# Altium schematic symbol library LATTICEPLDS_Library.SchLib: 291 symbols (part 6 of 32) (continued)
## LCMXO3L-4300/6900-BG400 (continued)
part D pins: M6 PL18C (io), M7 PL18D (io), M8 VCCIO3 (power), M9 VCCIO3 (power), N3 PL18A (io), N4 PL18B (io), N5 PL21C (io), N6 PL21D (io), P3 PL19A (io), P4 PL19B (io), P5 PL24C (io), P6 PL24D (io), R1 PL19C (io), R2 PL19D (io), R3 PL22C (io), R4 PL22D (io), R5 PL25B (io), T1 PL21A (io), T2 PL21B (io), T3 PL23A (io), T4 PL23B (io), T5 PL25A (io), U1 PL22A (io), U2 PL22B (io), U4 PL25C (io), U5 PL25D (io), V1 PL23C (io), V2 PL23D (io), V3 PL24A (io), V4 PL24B (io)
part E pins: J1 PL10B (io), J2 PL10A (io), K1 PL11B (io), K2 PL11A (io), K4 PL10D (io), K5 PL10C (io), K6 PL11C (io), K7 PL11D (io), K8 VCCIO4 (power), K9 VCCIO4 (power), L1 PL12A (io), L2 PL12B (io), L3 PL12C (io), L4 PL12D (io), L5 PL16A (io), L6 PL16C (io), L7 PL16D (io), M1 PL15A (io), M2 PL15B (io), M3 PL15C (io), M4 PL15D (io), M5 PL16B (io), N1 PL17A (io), N2 PL17B (io), P1 PL17C (io), P2 PL17D (io)
part F pins: C1 PL3B (io), C2 PL3A (io), C3 PL2B (io), C4 PL2A (io), D1 PL4B (io), D2 PL4A (io), E1 PL6B (io), E2 PL6A (io), E3 PL3D (io), E4 PL3C (io), F1 PL6D (io), F2 PL6C (io), F3 PL5B (io), F4 PL5A (io), F5 PL4C (io), F6 PL2C (io), G1 PL8B (io), G2 PL8A (io), G3 PL7B (io), G4 PL7A (io), G5 PL4D (io), G6 PL2D (io), H1 PL9B (io), H2 PL9A (io), H3 PL7C (io), H4 PL7D (io), H6 PL5C (io), H7 PL5D (io), J3 PL9D (io), J4 PL9C (io), J5 PL8D (io), J6 PL8C (io), J7 VCCIO5 (power), J8 VCCIO5 (power)
part G pins: C5 GND (power), D3 GND (power), D4 GND (power), E5 GND (power), E9 GND (power), E10 GND (power), E11 GND (power), E12 GND (power), E13 GND (power), E16 GND (power), E18 GND (power), G18 GND (power), H5 GND (power), H12 VCC (power), H13 VCC (power), J9 VCC (power), J10 VCC (power), J11 VCC (power), K3 GND (power), K10 GND (power), K11 GND (power), K12 VCC (power), L8 GND (power), L9 VCC (power), L10 GND (power), L11 GND (power), L12 VCC (power), L18 GND (power), M10 VCC (power), M11 GND (power), M12 VCC (power), N7 GND (power), R18 GND (power), T15 GND (power), U3 GND (power), U7 GND (power), U8 GND (power), U13 GND (power), U16 GND (power), V5 GND (power), V7 GND (power), V11 GND (power), V18 GND (power)
part A text: BANK0
part B text: BANK1
part C text: BANK2
part D text: BANK3
part E text: BANK4
part F text: BANK5

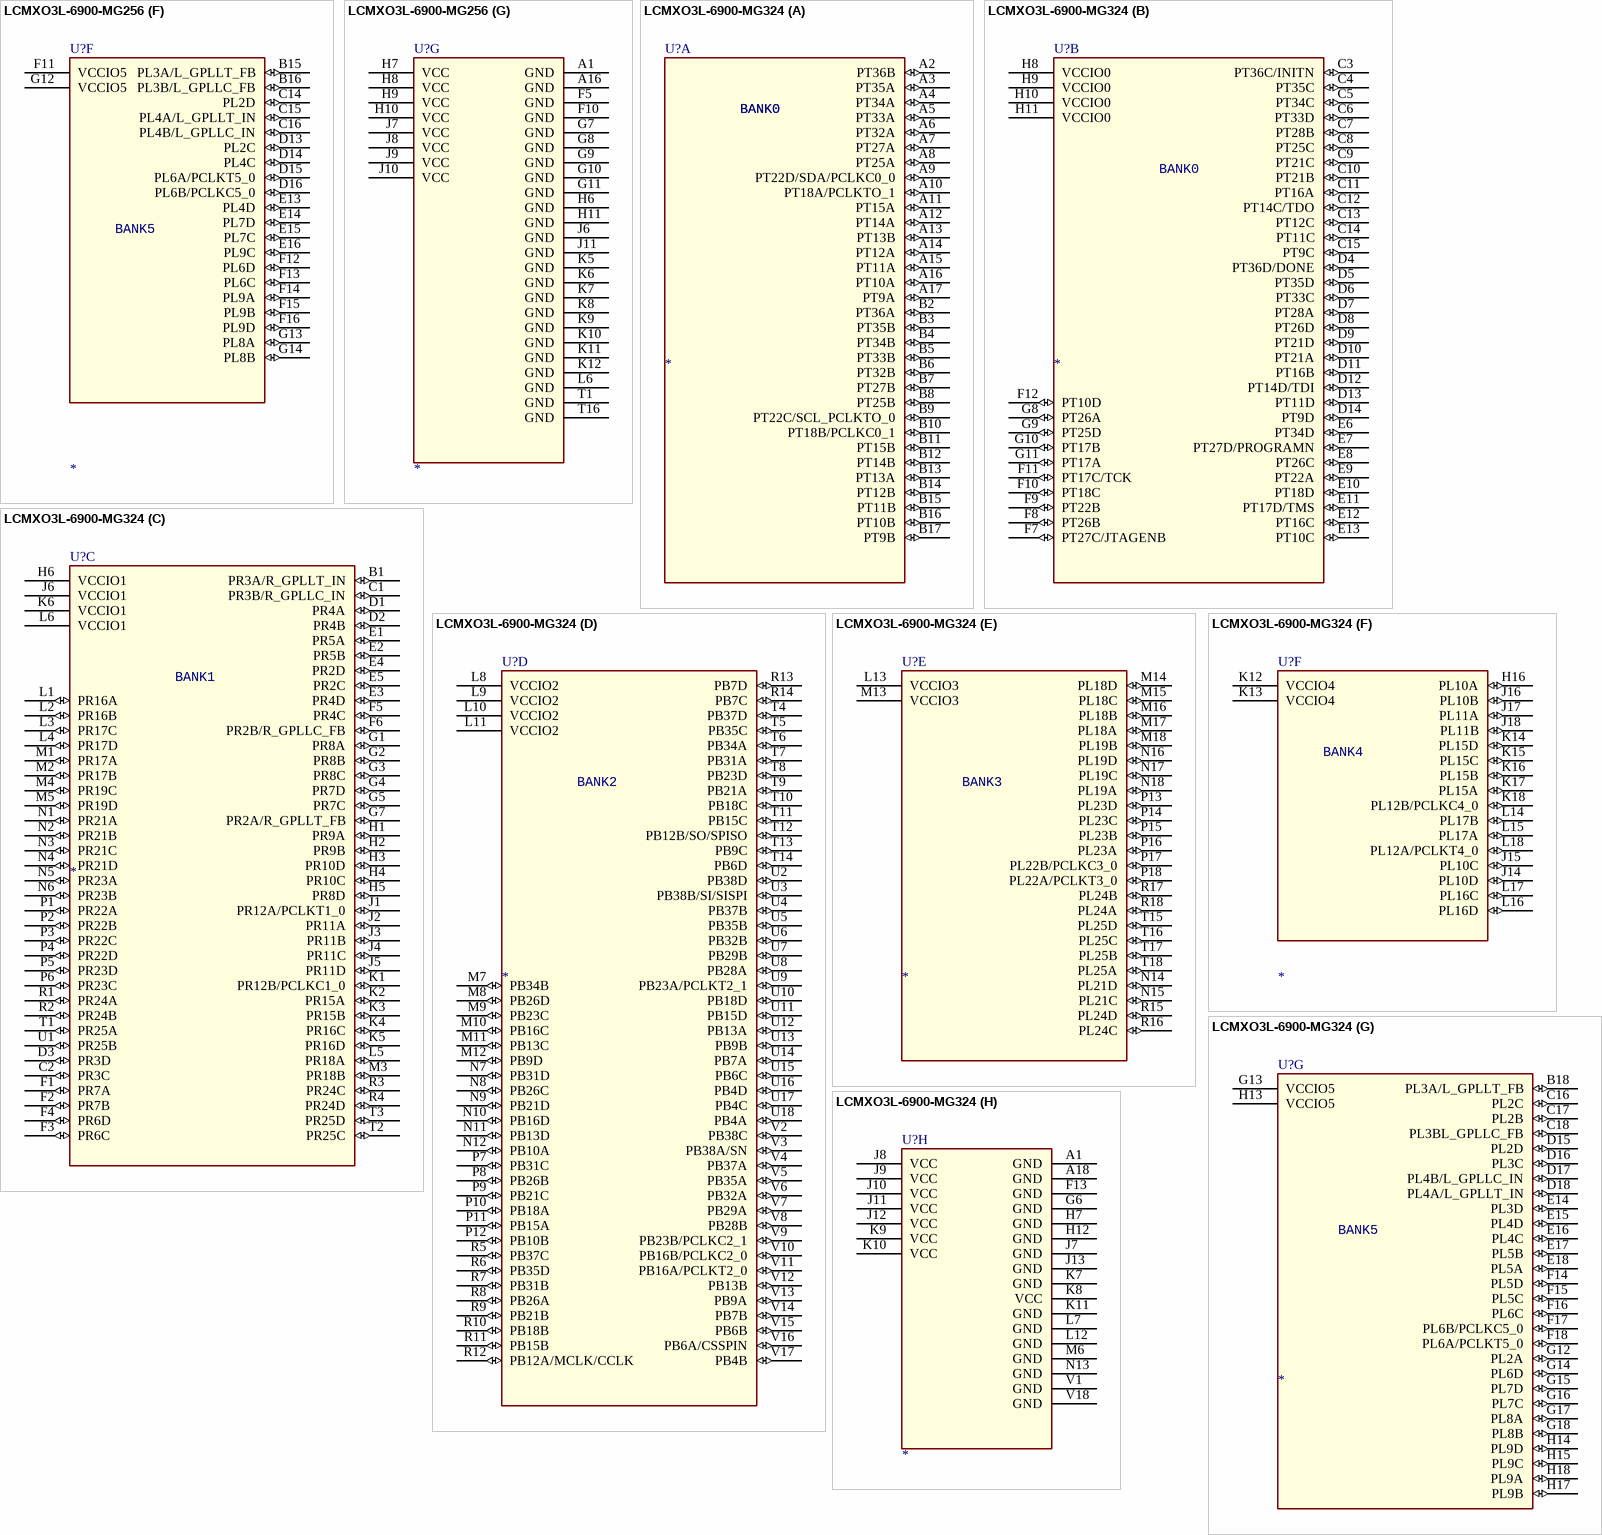
[diagram p62: symbols LCMXO3L-6900-MG256 to LCMXO3L-6900-MG324]

## LCMXO3L-6900-MG256
designator U?
SWAP_INFO: (S1+S2+S3+S4+S5+S6+S7); SPLIT_INST: TRUE
part A pins: A3 PT36A (io), A4 PT35A (io), A5 PT32A (io), A6 PT28A (io), A7 PT26B (io), A8 PT22C/SCL/PCLKT0_0 (io), A9 PT18B/PCLKC0_1 (io), A10 PT17B (io), A11 PT16A (io), A12 PT15B (io), A13 PT11A (io), A14 PT9A (io), A15 PT9C (io), B3 PT36B (io), B4 PT35B (io), B5 PT32B (io), B6 PT28B (io), B7 PT26A (io), B8 PT22D/SDA/PCLKC0_0 (io), B9 PT18A/PCLKT0_1 (io), B10 PT17A (io), B11 PT16B (io), B12 PT15A (io), B13 PT11B (io), B14 PT9B (io), C4 PT36C/INITN (io), C5 PT33B (io), C6 PT27D/PROGRAMN (io), C7 PT27C/JTAGENB (io), C8 PT22B (io), C9 PT22A (io), C10 PT17C/TCK (io), C11 PT17D/TMS (io), C12 PT14D/TDI (io), C13 PT12A (io), D5 PT36D/DONE (io), D6 PT33A (io), D7 PT27A (io), D8 PT25A (io), D9 PT21B (io), D10 PT14B (io), D11 PT14C/TDO (io), D12 PT12B (io), E5 PT34B (io), E6 PT34A (io), E7 PT27B (io), E8 PT25B (io), E9 PT21A (io), E10 PT14A (io), E11 PT10B (io), E12 PT10A (io), F6 VCCIO0 (power), F7 VCCIO0 (power), F8 VCCIO0 (power), F9 VCCIO0 (power)
part B pins: A2 PR2A/R_GPLLT_FB (io), B1 PR3A/R_GPLLT_IN (io), B2 PR2B/R_GPLLC_FB (io), C1 PR5B (io), C2 PR3B/R_GPLLC_IN (io), C3 PR4D (io), D1 PR7A (io), D2 PR5A (io), D3 PR4C (io), D4 PR2C (io), E1 PR10C (io), E2 PR7B (io), E3 PR7D (io), E4 PR2D (io), F1 PR11B (io), F2 PR10D (io), F3 PR7C (io), F4 PR6C (io), G1 PR12B/PCLKC1_0 (io), G2 PR11A (io), G3 PR9B (io), G4 PR9A (io), G5 PR6D (io), G6 VCCIO1 (power), H1 PR15A (io), H2 PR12A/PCLKT1_0 (io), H3 PR11D (io), H4 PR11C (io), H5 VCCIO1 (power), J1 PR16A (io), J2 PR15B (io), J3 PR16D (io), J4 PR16C (io), J5 VCCIO1 (power), K1 PR16B (io), K2 PR17A (io), K3 PR17D (io), K4 PR19C (io), L1 PR17B (io), L2 PR17C (io), L3 PR21C (io), L4 PR21D (io), L5 PR19D (io), M1 PR18A (io), M2 PR18B (io), M3 PR23A (io), M4 PR24B (io), N1 PR21A (io), N2 PR23B (io), N3 PR24A (io), N4 PR25D (io), P1 PR21B (io), P2 PR23D (io), P3 PR25C (io), R1 PR23C (io)
part C pins: L7 VCCIO2 (power), L8 VCCIO2 (power), L9 VCCIO2 (power), L10 VCCIO2 (power), M5 PB38A/SN (io), M6 PB35A (io), M7 PB31B (io), M8 PB26B (io), M9 PB18B (io), M10 PB13B (io), M11 PB9A (io), M12 PB4D (io), N5 PB38B/SI/SISPI (io), N6 PB35B (io), N7 PB31A (io), N8 PB26A (io), N9 PB18A (io), N10 PB13A (io), N11 PB9B (io), N12 PB4C (io), P4 PB38D (io), P5 PB38C (io), P6 PB28B (io), P7 PB28A (io), P8 PB18D (io), P9 PB18C (io), P10 PB13C (io), P11 PB10B (io), P12 PB7A (io), P13 PB4A (io), R2 PB37A (io), R3 PB34A (io), R4 PB31D (io), R5 PB29B (io), R6 PB26D (io), R7 PB23B/PCLKC2_1 (io), R8 PB21A (io), R9 PB16B/PCLKC2_0 (io), R10 PB13D (io), R11 PB12B/SO/SPISO (io), R12 PB10A (io), R13 PB7B (io), R14 PB4B (io), T2 PB37B (io), T3 PB34B (io), T4 PB31C (io), T5 PB29A (io), T6 PB26C (io), T7 PB23A/PCLKT2_1 (io), T8 PB21B (io), T9 PB16A/PCLKT2_0 (io), T10 PB15B (io), T11 PB15A (io), T12 PB12A/MCLK/CCLK (io), T13 PB6A/CSSPIN (io), T14 PB6B (io)
part D pins: K13 PL19C (io), L11 VCCIO3 (power), L12 VCCIO3 (power), L13 PL21D (io), L14 PL19D (io), M13 PL25A (io), M14 PL21C (io), M15 PL19B (io), N13 PL25B (io), N14 PL25C (io), N15 PL22B/PCLKC3_0 (io), N16 PL19A (io), P14 PL25D (io), P15 PL23C (io), P16 PL22A/PCLKT3_0 (io), R15 PL24A (io), R16 PL23D (io), T15 PL24B (io)
part E pins: G15 PL10A (io), G16 PL10B (io), H12 VCCIO4 (power), H13 PL10C (io), H14 PL10D (io), H15 PL11A (io), H16 PL11B (io), J12 VCCIO4 (power), J13 PL15C (io), J14 PL15D (io), J15 PL12B/PCLKC4_0 (io), J16 PL12A/PCLKT4_0 (io), K14 PL16D (io), K15 PL15B (io), K16 PL15A (io), L15 PL17B (io), L16 PL16C (io), M16 PL17A (io)
part F pins: B15 PL3A/L_GPLLT_FB (io), B16 PL3B/L_GPLLC_FB (io), C14 PL2D (io), C15 PL4A/L_GPLLT_IN (io), C16 PL4B/L_GPLLC_IN (io), D13 PL2C (io), D14 PL4C (io), D15 PL6A/PCLKT5_0 (io), D16 PL6B/PCLKC5_0 (io), E13 PL4D (io), E14 PL7D (io), E15 PL7C (io), E16 PL9C (io), F11 VCCIO5 (power), F12 PL6D (io), F13 PL6C (io), F14 PL9A (io), F15 PL9B (io), F16 PL9D (io), G12 VCCIO5 (power), G13 PL8A (io), G14 PL8B (io)
part G pins: A1 GND (power), A16 GND (power), F5 GND (power), F10 GND (power), G7 GND (power), G8 GND (power), G9 GND (power), G10 GND (power), G11 GND (power), H6 GND (power), H7 VCC (power), H8 VCC (power), H9 VCC (power), H10 VCC (power), H11 GND (power), J6 GND (power), J7 VCC (power), J8 VCC (power), J9 VCC (power), J10 VCC (power), J11 GND (power), K5 GND (power), K6 GND (power), K7 GND (power), K8 GND (power), K9 GND (power), K10 GND (power), K11 GND (power), K12 GND (power), L6 GND (power), T1 GND (power), T16 GND (power)
part A text: BANK0
part B text: BANK1
part C text: BANK2
part D text: BANK3
part E text: BANK4
part F text: BANK5

## LCMXO3L-6900-MG324
designator U?
SPLIT_INST: TRUE; SWAP_INFO: (S1+S2+S3+S4+S5+S6+S7+S8)
part A pins: A2 PT36B (io), A3 PT35A (io), A4 PT34A (io), A5 PT33A (io), A6 PT32A (io), A7 PT27A (io), A8 PT25A (io), A9 PT22D/SDA/PCLKC0_0 (io), A10 PT18A/PCLKTO_1 (io), A11 PT15A (io), A12 PT14A (io), A13 PT13B (io), A14 PT12A (io), A15 PT11A (io), A16 PT10A (io), A17 PT9A (io), B2 PT36A (io), B3 PT35B (io), B4 PT34B (io), B5 PT33B (io), B6 PT32B (io), B7 PT27B (io), B8 PT25B (io), B9 PT22C/SCL_PCLKTO_0 (io), B10 PT18B/PCLKC0_1 (io), B11 PT15B (io), B12 PT14B (io), B13 PT13A (io), B14 PT12B (io), B15 PT11B (io), B16 PT10B (io), B17 PT9B (io)
part B pins: C3 PT36C/INITN (io), C4 PT35C (io), C5 PT34C (io), C6 PT33D (io), C7 PT28B (io), C8 PT25C (io), C9 PT21C (io), C10 PT21B (io), C11 PT16A (io), C12 PT14C/TDO (io), C13 PT12C (io), C14 PT11C (io), C15 PT9C (io), D4 PT36D/DONE (io), D5 PT35D (io), D6 PT33C (io), D7 PT28A (io), D8 PT26D (io), D9 PT21D (io), D10 PT21A (io), D11 PT16B (io), D12 PT14D/TDI (io), D13 PT11D (io), D14 PT9D (io), E6 PT34D (io), E7 PT27D/PROGRAMN (io), E8 PT26C (io), E9 PT22A (io), E10 PT18D (io), E11 PT17D/TMS (io), E12 PT16C (io), E13 PT10C (io), F7 PT27C/JTAGENB (io), F8 PT26B (io), F9 PT22B (io), F10 PT18C (io), F11 PT17C/TCK (io), F12 PT10D (io), G8 PT26A (io), G9 PT25D (io), G10 PT17B (io), G11 PT17A (io), H8 VCCIO0 (power), H9 VCCIO0 (power), H10 VCCIO0 (power), H11 VCCIO0 (power)
part C pins: B1 PR3A/R_GPLLT_IN (io), C1 PR3B/R_GPLLC_IN (io), C2 PR3C (io), D1 PR4A (io), D2 PR4B (io), D3 PR3D (io), E1 PR5A (io), E2 PR5B (io), E3 PR4D (io), E4 PR2D (io), E5 PR2C (io), F1 PR7A (io), F2 PR7B (io), F3 PR6C (io), F4 PR6D (io), F5 PR4C (io), F6 PR2B/R_GPLLC_FB (io), G1 PR8A (io), G2 PR8B (io), G3 PR8C (io), G4 PR7D (io), G5 PR7C (io), G7 PR2A/R_GPLLT_FB (io), H1 PR9A (io), H2 PR9B (io), H3 PR10D (io), H4 PR10C (io), H5 PR8D (io), H6 VCCIO1 (power), J1 PR12A/PCLKT1_0 (io), J2 PR11A (io), J3 PR11B (io), J4 PR11C (io), J5 PR11D (io), J6 VCCIO1 (power), K1 PR12B/PCLKC1_0 (io), K2 PR15A (io), K3 PR15B (io), K4 PR16C (io), K5 PR16D (io), K6 VCCIO1 (power), L1 PR16A (io), L2 PR16B (io), L3 PR17C (io), L4 PR17D (io), L5 PR18A (io), L6 VCCIO1 (power), M1 PR17A (io), M2 PR17B (io), M3 PR18B (io), M4 PR19C (io), M5 PR19D (io), N1 PR21A (io), N2 PR21B (io), N3 PR21C (io), N4 PR21D (io), N5 PR23A (io), N6 PR23B (io), P1 PR22A (io), P2 PR22B (io), P3 PR22C (io), P4 PR22D (io), P5 PR23D (io), P6 PR23C (io), R1 PR24A (io), R2 PR24B (io), R3 PR24C (io), R4 PR24D (io), T1 PR25A (io), T2 PR25C (io), T3 PR25D (io), U1 PR25B (io)
part D pins: L8 VCCIO2 (power), L9 VCCIO2 (power), L10 VCCIO2 (power), L11 VCCIO2 (power), M7 PB34B (io), M8 PB26D (io), M9 PB23C (io), M10 PB16C (io), M11 PB13C (io), M12 PB9D (io), N7 PB31D (io), N8 PB26C (io), N9 PB21D (io), N10 PB16D (io), N11 PB13D (io), N12 PB10A (io), P7 PB31C (io), P8 PB26B (io), P9 PB21C (io), P10 PB18A (io), P11 PB15A (io), P12 PB10B (io), R5 PB37C (io), R6 PB35D (io), R7 PB31B (io), R8 PB26A (io), R9 PB21B (io), R10 PB18B (io), R11 PB15B (io), R12 PB12A/MCLK/CCLK (io), R13 PB7D (io), R14 PB7C (io), T4 PB37D (io), T5 PB35C (io), T6 PB34A (io), T7 PB31A (io), T8 PB23D (io), T9 PB21A (io), T10 PB18C (io), T11 PB15C (io), T12 PB12B/SO/SPISO (io), T13 PB9C (io), T14 PB6D (io), U2 PB38D (io), U3 PB38B/SI/SISPI (io), U4 PB37B (io), U5 PB35B (io), U6 PB32B (io), U7 PB29B (io), U8 PB28A (io), U9 PB23A/PCLKT2_1 (io), U10 PB18D (io), U11 PB15D (io), U12 PB13A (io), U13 PB9B (io), U14 PB7A (io), U15 PB6C (io), U16 PB4D (io), U17 PB4C (io), U18 PB4A (io), V2 PB38C (io), V3 PB38A/SN (io), V4 PB37A (io), V5 PB35A (io), V6 PB32A (io), V7 PB29A (io), V8 PB28B (io), V9 PB23B/PCLKC2_1 (io), V10 PB16B/PCLKC2_0 (io), V11 PB16A/PCLKT2_0 (io), V12 PB13B (io), V13 PB9A (io), V14 PB7B (io), V15 PB6B (io), V16 PB6A/CSSPIN (io), V17 PB4B (io)
part E pins: L13 VCCIO3 (power), M13 VCCIO3 (power), M14 PL18D (io), M15 PL18C (io), M16 PL18B (io), M17 PL18A (io), M18 PL19B (io), N14 PL21D (io), N15 PL21C (io), N16 PL19D (io), N17 PL19C (io), N18 PL19A (io), P13 PL23D (io), P14 PL23C (io), P15 PL23B (io), P16 PL23A (io), P17 PL22B/PCLKC3_0 (io), P18 PL22A/PCLKT3_0 (io), R15 PL24D (io), R16 PL24C (io), R17 PL24B (io), R18 PL24A (io), T15 PL25D (io), T16 PL25C (io), T17 PL25B (io), T18 PL25A (io)
part F pins: H16 PL10A (io), J14 PL10D (io), J15 PL10C (io), J16 PL10B (io), J17 PL11A (io), J18 PL11B (io), K12 VCCIO4 (power), K13 VCCIO4 (power), K14 PL15D (io), K15 PL15C (io), K16 PL15B (io), K17 PL15A (io), K18 PL12B/PCLKC4_0 (io), L14 PL17B (io), L15 PL17A (io), L16 PL16D (io), L17 PL16C (io), L18 PL12A/PCLKT4_0 (io)
part G pins: B18 PL3A/L_GPLLT_FB (io), C16 PL2C (io), C17 PL2B (io), C18 PL3BL_GPLLC_FB (io), D15 PL2D (io), D16 PL3C (io), D17 PL4B/L_GPLLC_IN (io), D18 PL4A/L_GPLLT_IN (io), E14 PL3D (io), E15 PL4D (io), E16 PL4C (io), E17 PL5B (io), E18 PL5A (io), F14 PL5D (io), F15 PL5C (io), F16 PL6C (io), F17 PL6B/PCLKC5_0 (io), F18 PL6A/PCLKT5_0 (io), G12 PL2A (io), G13 VCCIO5 (power), G14 PL6D (io), G15 PL7D (io), G16 PL7C (io), G17 PL8A (io), G18 PL8B (io), H13 VCCIO5 (power), H14 PL9D (io), H15 PL9C (io), H17 PL9B (io), H18 PL9A (io)
part H pins: A1 GND (power), A18 GND (power), F13 GND (power), G6 GND (power), H7 GND (power), H12 GND (power), J7 GND (power), J8 VCC (power), J9 VCC (power), J10 VCC (power), J11 VCC (power), J12 VCC (power), J13 GND (power), K7 GND (power), K8 VCC (power), K9 VCC (power), K10 VCC (power), K11 GND (power), L7 GND (power), L12 GND (power), M6 GND (power), N13 GND (power), V1 GND (power), V18 GND (power)
part A text: BANK0
part B text: BANK0
part C text: BANK1
part D text: BANK2
part E text: BANK3
part F text: BANK4
part G text: BANK5

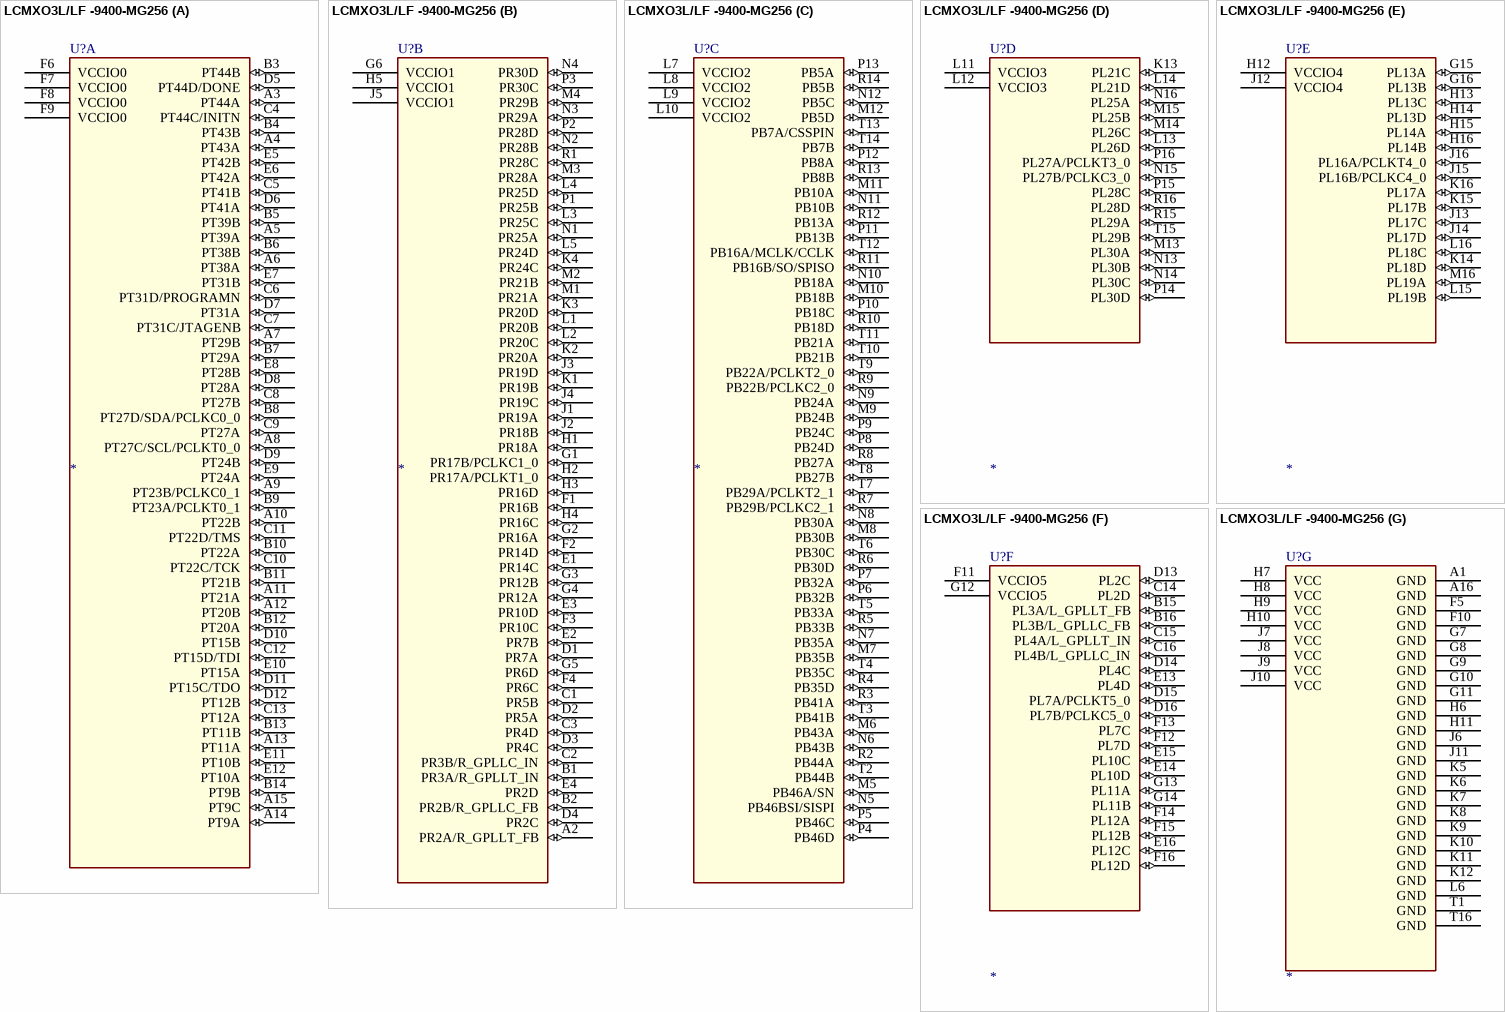
[diagram p63: symbol LCMXO3L/LF -9400-MG256]

## LCMXO3L/LF -9400-MG256
designator U?
SWAP_INFO: (S1+S2+S3+S4+S5+S6+S7); SPLIT_INST: TRUE
part A pins: A3 PT44A (io), A4 PT43A (io), A5 PT39A (io), A6 PT38A (io), A7 PT29B (io), A8 PT27C/SCL/PCLKT0_0 (io), A9 PT23B/PCLKC0_1 (io), A10 PT22B (io), A11 PT21A (io), A12 PT20B (io), A13 PT11A (io), A14 PT9A (io), A15 PT9C (io), B3 PT44B (io), B4 PT43B (io), B5 PT39B (io), B6 PT38B (io), B7 PT29A (io), B8 PT27D/SDA/PCLKC0_0 (io), B9 PT23A/PCLKT0_1 (io), B10 PT22A (io), B11 PT21B (io), B12 PT20A (io), B13 PT11B (io), B14 PT9B (io), C4 PT44C/INITN (io), C5 PT41B (io), C6 PT31D/PROGRAMN (io), C7 PT31C/JTAGENB (io), C8 PT27B (io), C9 PT27A (io), C10 PT22C/TCK (io), C11 PT22D/TMS (io), C12 PT15D/TDI (io), C13 PT12A (io), D5 PT44D/DONE (io), D6 PT41A (io), D7 PT31A (io), D8 PT28A (io), D9 PT24B (io), D10 PT15B (io), D11 PT15C/TDO (io), D12 PT12B (io), E5 PT42B (io), E6 PT42A (io), E7 PT31B (io), E8 PT28B (io), E9 PT24A (io), E10 PT15A (io), E11 PT10B (io), E12 PT10A (io), F6 VCCIO0 (power), F7 VCCIO0 (power), F8 VCCIO0 (power), F9 VCCIO0 (power)
part B pins: A2 PR2A/R_GPLLT_FB (io), B1 PR3A/R_GPLLT_IN (io), B2 PR2B/R_GPLLC_FB (io), C1 PR5B (io), C2 PR3B/R_GPLLC_IN (io), C3 PR4D (io), D1 PR7A (io), D2 PR5A (io), D3 PR4C (io), D4 PR2C (io), E1 PR14C (io), E2 PR7B (io), E3 PR10D (io), E4 PR2D (io), F1 PR16B (io), F2 PR14D (io), F3 PR10C (io), F4 PR6C (io), G1 PR17B/PCLKC1_0 (io), G2 PR16A (io), G3 PR12B (io), G4 PR12A (io), G5 PR6D (io), G6 VCCIO1 (power), H1 PR18A (io), H2 PR17A/PCLKT1_0 (io), H3 PR16D (io), H4 PR16C (io), H5 VCCIO1 (power), J1 PR19A (io), J2 PR18B (io), J3 PR19D (io), J4 PR19C (io), J5 VCCIO1 (power), K1 PR19B (io), K2 PR20A (io), K3 PR20D (io), K4 PR24C (io), L1 PR20B (io), L2 PR20C (io), L3 PR25C (io), L4 PR25D (io), L5 PR24D (io), M1 PR21A (io), M2 PR21B (io), M3 PR28A (io), M4 PR29B (io), N1 PR25A (io), N2 PR28B (io), N3 PR29A (io), N4 PR30D (io), P1 PR25B (io), P2 PR28D (io), P3 PR30C (io), R1 PR28C (io)
part C pins: L7 VCCIO2 (power), L8 VCCIO2 (power), L9 VCCIO2 (power), L10 VCCIO2 (power), M5 PB46A/SN (io), M6 PB43A (io), M7 PB35B (io), M8 PB30B (io), M9 PB24B (io), M10 PB18B (io), M11 PB10A (io), M12 PB5D (io), N5 PB46BSI/SISPI (io), N6 PB43B (io), N7 PB35A (io), N8 PB30A (io), N9 PB24A (io), N10 PB18A (io), N11 PB10B (io), N12 PB5C (io), P4 PB46D (io), P5 PB46C (io), P6 PB32B (io), P7 PB32A (io), P8 PB24D (io), P9 PB24C (io), P10 PB18C (io), P11 PB13B (io), P12 PB8A (io), P13 PB5A (io), R2 PB44A (io), R3 PB41A (io), R4 PB35D (io), R5 PB33B (io), R6 PB30D (io), R7 PB29B/PCLKC2_1 (io), R8 PB27A (io), R9 PB22B/PCLKC2_0 (io), R10 PB18D (io), R11 PB16B/SO/SPISO (io), R12 PB13A (io), R13 PB8B (io), R14 PB5B (io), T2 PB44B (io), T3 PB41B (io), T4 PB35C (io), T5 PB33A (io), T6 PB30C (io), T7 PB29A/PCLKT2_1 (io), T8 PB27B (io), T9 PB22A/PCLKT2_0 (io), T10 PB21B (io), T11 PB21A (io), T12 PB16A/MCLK/CCLK (io), T13 PB7A/CSSPIN (io), T14 PB7B (io)
part D pins: K13 PL21C (io), L11 VCCIO3 (power), L12 VCCIO3 (power), L13 PL26D (io), L14 PL21D (io), M13 PL30A (io), M14 PL26C (io), M15 PL25B (io), N13 PL30B (io), N14 PL30C (io), N15 PL27B/PCLKC3_0 (io), N16 PL25A (io), P14 PL30D (io), P15 PL28C (io), P16 PL27A/PCLKT3_0 (io), R15 PL29A (io), R16 PL28D (io), T15 PL29B (io)
part E pins: G15 PL13A (io), G16 PL13B (io), H12 VCCIO4 (power), H13 PL13C (io), H14 PL13D (io), H15 PL14A (io), H16 PL14B (io), J12 VCCIO4 (power), J13 PL17C (io), J14 PL17D (io), J15 PL16B/PCLKC4_0 (io), J16 PL16A/PCLKT4_0 (io), K14 PL18D (io), K15 PL17B (io), K16 PL17A (io), L15 PL19B (io), L16 PL18C (io), M16 PL19A (io)
part F pins: B15 PL3A/L_GPLLT_FB (io), B16 PL3B/L_GPLLC_FB (io), C14 PL2D (io), C15 PL4A/L_GPLLT_IN (io), C16 PL4B/L_GPLLC_IN (io), D13 PL2C (io), D14 PL4C (io), D15 PL7A/PCLKT5_0 (io), D16 PL7B/PCLKC5_0 (io), E13 PL4D (io), E14 PL10D (io), E15 PL10C (io), E16 PL12C (io), F11 VCCIO5 (power), F12 PL7D (io), F13 PL7C (io), F14 PL12A (io), F15 PL12B (io), F16 PL12D (io), G12 VCCIO5 (power), G13 PL11A (io), G14 PL11B (io)
part G pins: A1 GND (power), A16 GND (power), F5 GND (power), F10 GND (power), G7 GND (power), G8 GND (power), G9 GND (power), G10 GND (power), G11 GND (power), H6 GND (power), H7 VCC (power), H8 VCC (power), H9 VCC (power), H10 VCC (power), H11 GND (power), J6 GND (power), J7 VCC (power), J8 VCC (power), J9 VCC (power), J10 VCC (power), J11 GND (power), K5 GND (power), K6 GND (power), K7 GND (power), K8 GND (power), K9 GND (power), K10 GND (power), K11 GND (power), K12 GND (power), L6 GND (power), T1 GND (power), T16 GND (power)

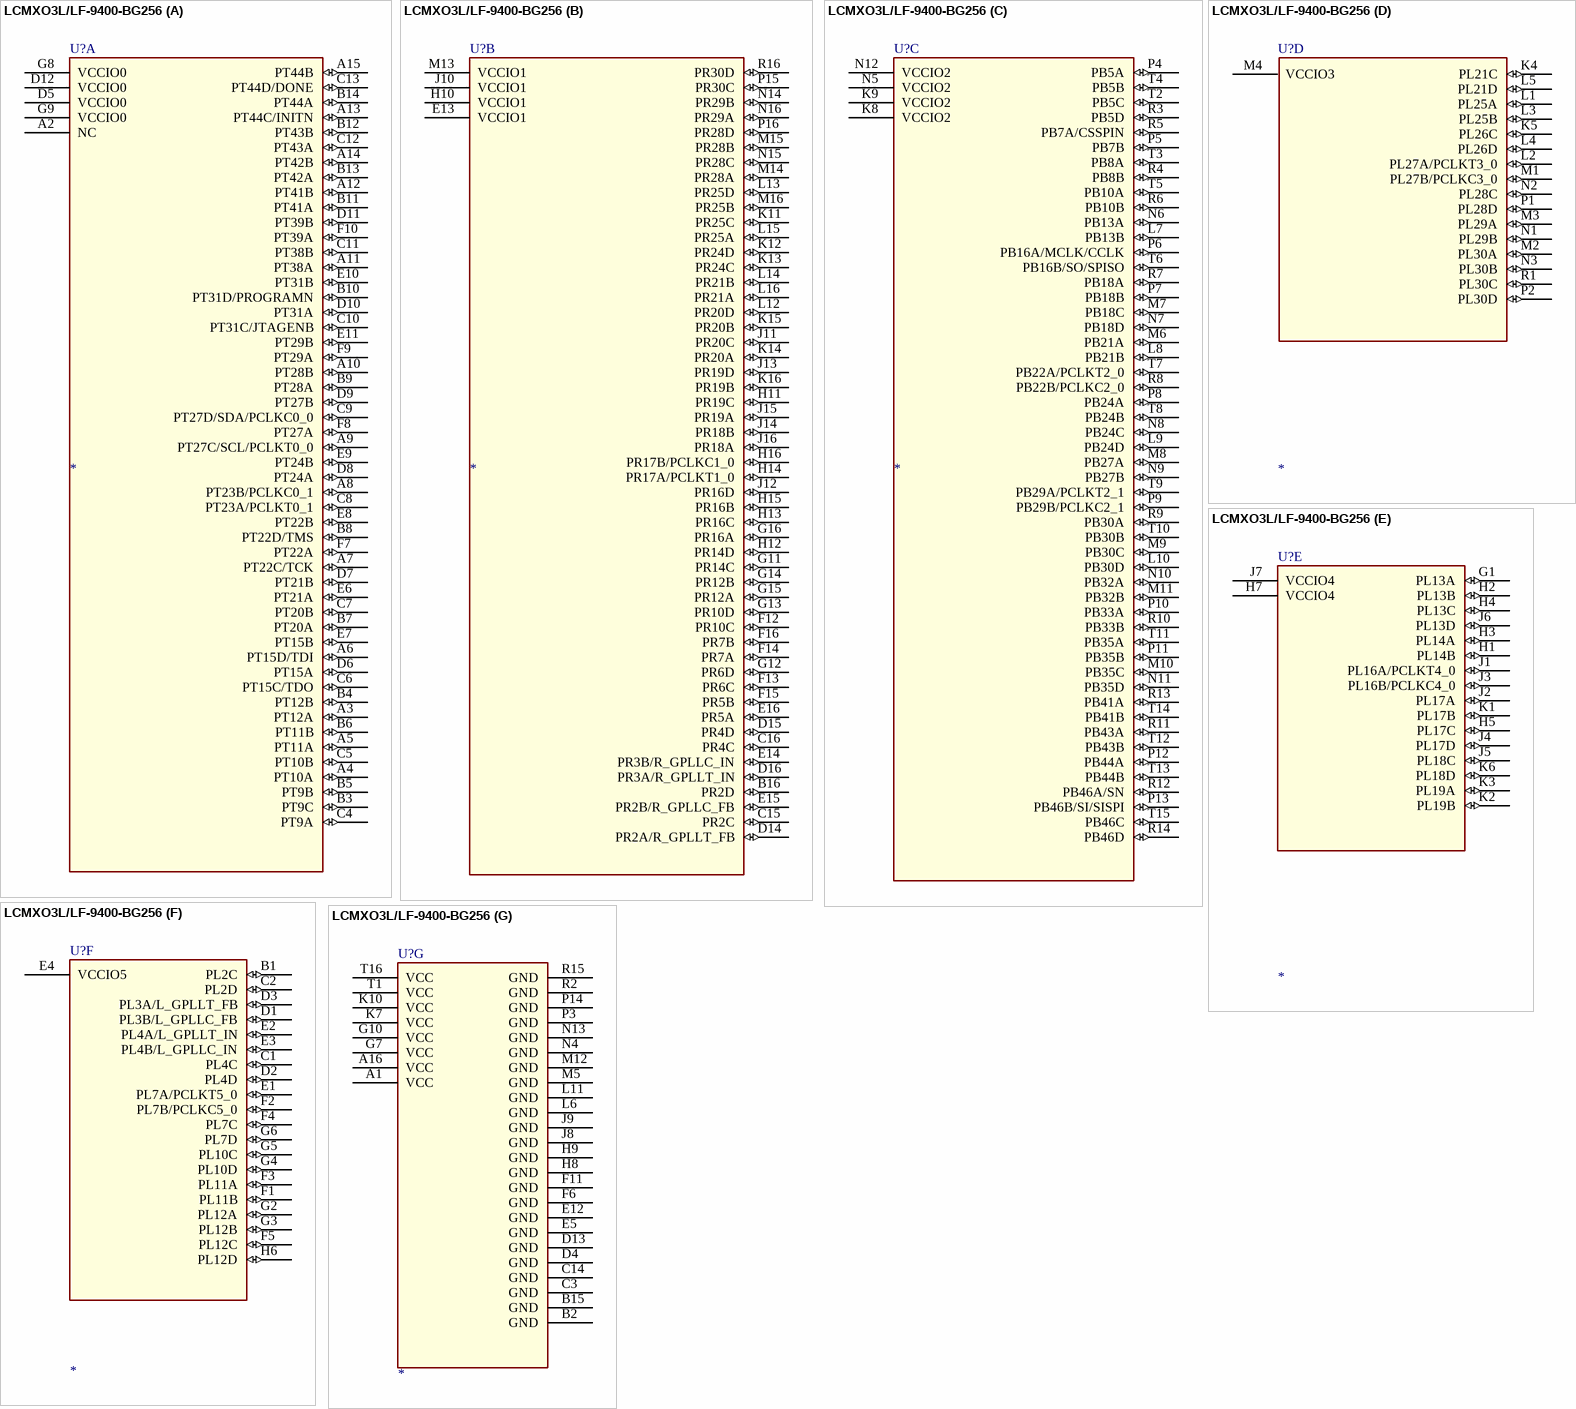
[diagram p64: symbol LCMXO3L/LF-9400-BG256]